# Altium integrated library Customized_Library1.intlib: 79 symbols
Pins are listed as number, name and electrical type; pins without a type are passive.

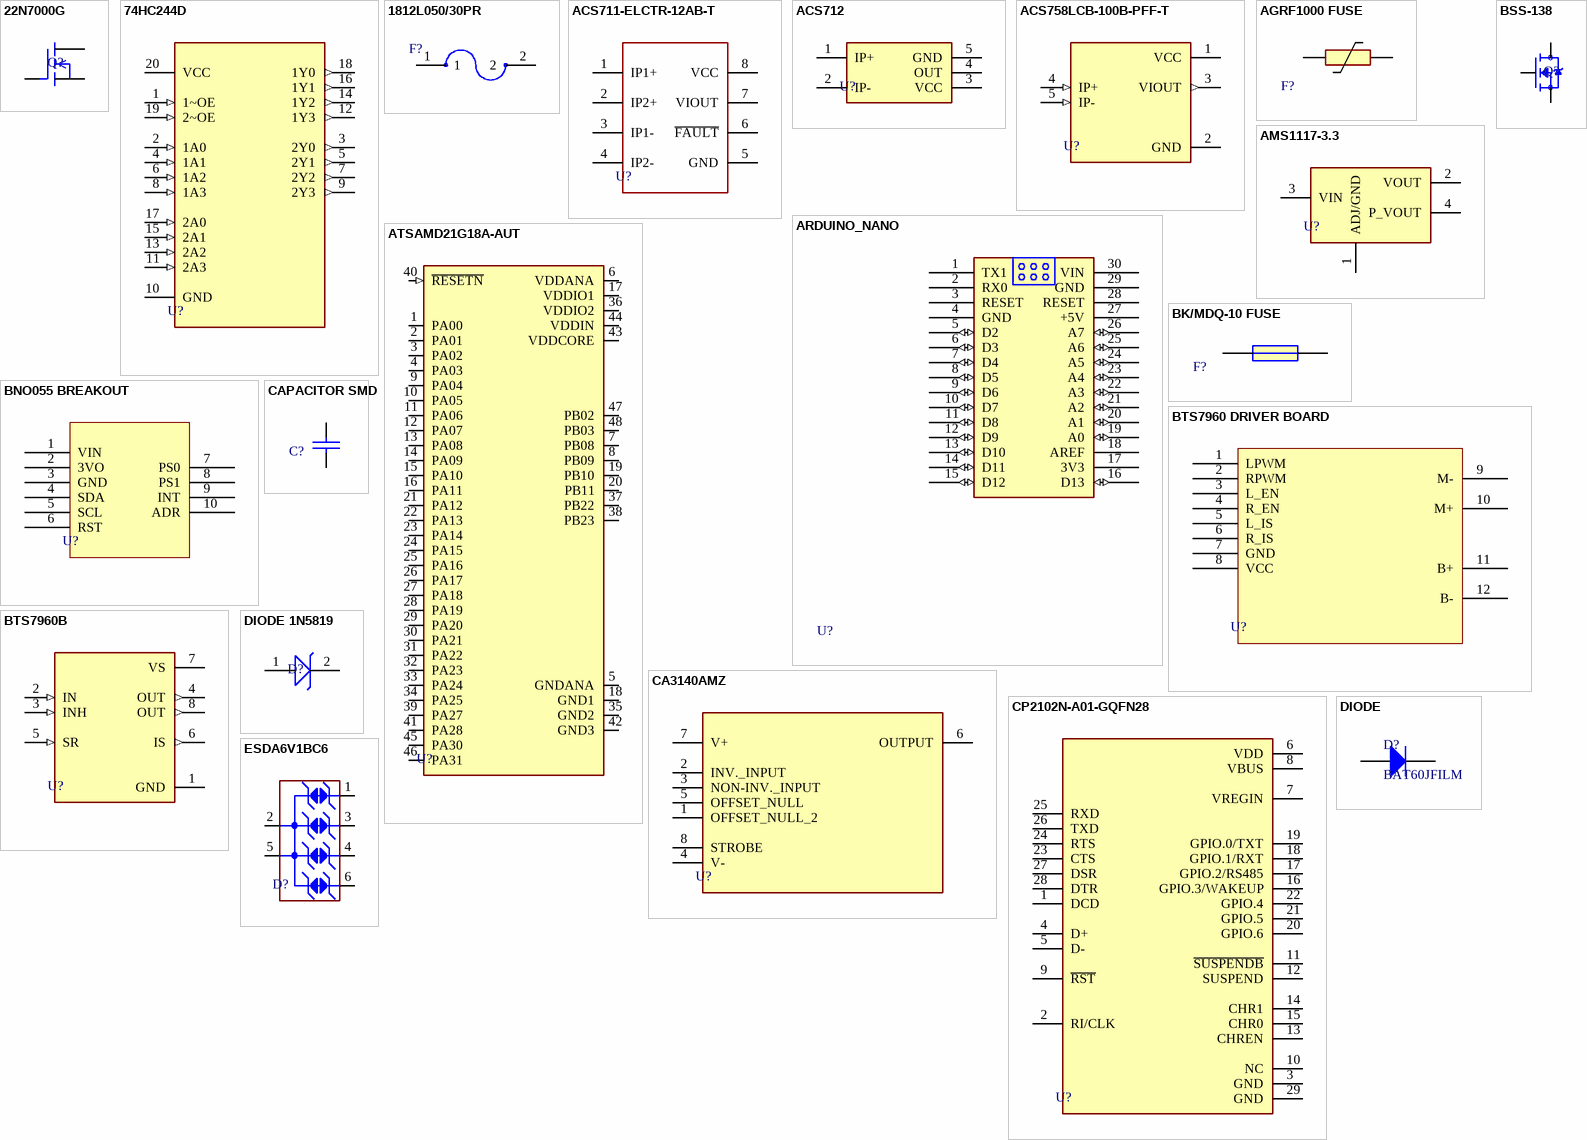
[diagram p0: symbols 22N7000G to ESDA6V1BC6]

## 22N7000G
designator Q?
N-Channel 60 V 200mA (Tj) 1W (Tc) Through Hole TO-92-3
footprint 2N7000G
pins: 1 S, 2 G, 3 D

## 74HC244D
designator U?
Buffer, Non-Inverting 2 Element 4 Bit per Element 3-State Output 20-SO
footprint 74HC244D (Buffer, Non-Inverting 2 Element 4 Bit per Element 3-State Output 20-SO)
pins: 1 1~OE (in), 2 1A0 (in), 3 2Y0 (out), 4 1A1 (in), 5 2Y1 (out), 6 1A2 (in), 7 2Y2 (out), 8 1A3 (in), 9 2Y3 (out), 10 GND, 11 2A3 (in), 12 1Y3 (out), 13 2A2 (in), 14 1Y2 (out), 15 2A1 (in), 16 1Y1 (out), 17 2A0 (in), 18 1Y0 (out), 19 2~OE (in), 20 VCC (power)

## 1812L050/30PR
designator F?
PTC Resettable Fuse 0.5A(hold) 1A(trip) 30VDC 100A 0.8W 0.15s 0.15Ohm SMD Solder Pad 1812 T/R
footprint 1812L050/30PR (PTC Resettable Fuse 0.5A(hold) 1A(trip) 30VDC 100A 0.8W 0.15s 0.15Ohm SMD Solder Pad 1812 T/R)
pins: 1, 2

## ACS711-ELCTR-12AB-T
designator U?  (value not drawn)
CURRENT SENSOR
footprint ACS711-ELCTR-12AB-T
pins: 1 IP1+, 2 IP2+, 3 IP1-, 4 IP2-, 5 GND, 6 ~{FAULT}, 7 VIOUT, 8 VCC

## ACS712
designator U?  (value not drawn)
CURRENT SENSOR BOARD
footprint ACS712 (CURRENT SENSOR)
pins: 1 IP+, 2 IP-, 3 VCC, 4 OUT, 5 GND

## ACS758LCB-100B-PFF-T
designator U?
Current Sensor 100A 1 Channel Hall Effect, Open Loop Bidirectional 5-CB Formed Leads, PFF
footprint ACS758LCB-100B-PFF-T (Current Sensor 100A 1 Channel Hall Effect, Open Loop Bidirectional 5-CB Formed Leads, PFF)
pins: 1 VCC (power), 2 GND (power), 3 VIOUT (out), 4 IP+ (in), 5 IP- (in)

## AGRF1000 FUSE
designator F?, comment Resettable Fuse  (value not drawn)
HOLD CURRENT 9.6 AMP, TRIP CURRENT 18.5 AMP
footprint AGRF1000 FUSE (Resettable_Fuse)
pins: 1, 2

## AMS1117-3.3
designator U?
VOLTAGE REGULATOR INPUT-5V;OUTPUT-3V3
footprint AMS1117-3.3
pins: 1 ADJ/GND, 2 VOUT, 3 VIN, 4 P_VOUT

## ARDUINO_NANO
designator U?
DEVELOPMENT BOARD
footprint ARDUINO_NANO
pins: 1 TX1, 2 RX0, 3 RESET, 4 GND (power), 5 D2 (io), 6 D3 (io), 7 D4 (io), 8 D5 (io), 9 D6 (io), 10 D7 (io), 11 D8 (io), 12 D9 (io), 13 D10 (io), 14 D11 (io), 15 D12 (io), 16 D13 (io), 17 3V3 (power), 18 AREF, 19 A0 (io), 20 A1 (io), 21 A2 (io), 22 A3 (io), 23 A4 (io), 24 A5 (io), 25 A6 (io), 26 A7 (io), 27 +5V (power), 28 RESET, 29 GND (power), 30 VIN (power)

## ATSAMD21G18A-AUT
designator U?
ARM® Cortex®-M0+ SAM D21G, Functional Safety (FuSa) Microcontroller IC 32-Bit Single-Core 48MHz 256KB (256K x 8) FLASH 48-TQFP (7x7)
footprint ATSAMD21G18A-AUT (ARM® Cortex®-M0+ SAM D21G, Functional Safety (FuSa) Microcontroller IC 32-Bit Single-Core 48MHz 256KB (256K x 8) FLASH 48-TQFP (7x7))
pins: 1 PA00 (io), 2 PA01 (io), 3 PA02 (io), 4 PA03 (io), 5 GNDANA (power), 6 VDDANA (power), 7 PB08 (io), 8 PB09 (io), 9 PA04 (io), 10 PA05 (io), 11 PA06 (io), 12 PA07 (io), 13 PA08 (io), 14 PA09 (io), 15 PA10 (io), 16 PA11 (io), 17 VDDIO1 (power), 18 GND1 (power), 19 PB10 (io), 20 PB11 (io), 21 PA12 (io), 22 PA13 (io), 23 PA14 (io), 24 PA15 (io), 25 PA16 (io), 26 PA17 (io), 27 PA18 (io), 28 PA19 (io), 29 PA20 (io), 30 PA21 (io), 31 PA22 (io), 32 PA23 (io), 33 PA24 (io), 34 PA25 (io), 35 GND2 (power), 36 VDDIO2 (power), 37 PB22 (io), 38 PB23 (io), 39 PA27 (io), 40 ~{RESETN} (in), 41 PA28 (io), 42 GND3 (power), 43 VDDCORE (power), 44 VDDIN (power), 45 PA30 (io), 46 PA31 (io), 47 PB02 (io), 48 PB03 (io)

## BK/MDQ-10 FUSE
designator F?, comment FUSE 15 AMP  (value not drawn)
OVERCURRENT PROTECTION
footprint BK/MDQ-10
pins: 1, 2

## BNO055 BREAKOUT
designator U?
10 PIN, 2.54mm pitch
footprint BNO055 BREAKOUT
pins: 1 VIN, 2 3VO, 3 GND, 4 SDA, 5 SCL, 6 RST, 7 PS0, 8 PS1, 9 INT, 10 ADR

## BSS-138
designator Q?, comment N CHANNEL FIELD EFFECT TRANSISTOR  (value not drawn)
MOSFET
footprint BSS-138
pins: 1 G, 2 S, 3 D

## BTS7960 DRIVER BOARD
designator U?
MOTOR DRIVER, 12 PIN
footprint BTS7960_DRIVER_BOARD
pins: 1 LPWM, 2 RPWM, 3 L_EN, 4 R_EN, 5 L_IS, 6 R_IS, 7 GND, 8 VCC, 9 M-, 10 M+, 11 B+, 12 B-

## BTS7960B
designator U?
Half Bridge Driver DC Motors, General Purpose DMOS PG-TO263-7-1
footprint BTS7960B (Footprint not found)
pins: 1 GND (power), 2 IN (in), 3 INH (in), 4 OUT (out), 5 SR (in), 6 IS (out), 7 VS (power), 8 OUT (out)

## CA3140AMZ
designator U?
General Purpose Amplifier 1 Circuit - 8-SOIC
footprint CA3140AMZ
pins: 1 OFFSET_NULL_2, 2 INV._INPUT, 3 NON-INV._INPUT, 4 V- (power), 5 OFFSET_NULL, 6 OUTPUT, 7 V+ (power), 8 STROBE

## CAPACITOR SMD
designator C?
CAPACITOR
footprint CAPACITOR SMD
pins: 1, 2

## CP2102N-A01-GQFN28
designator U?
USB BRIDGE, USB to UART USB 2.0 UART INTERFACE 28-QFN
footprint CP2102N-A01-GQFN28
pins: 1 DCD, 2 RI/CLK, 3 GND, 4 D+, 5 D-, 6 VDD, 7 VREGIN, 8 VBUS, 9 ~{RST}, 10 NC, 11 ~{SUSPENDB}, 12 SUSPEND, 13 CHREN, 14 CHR1, 15 CHR0, 16 GPIO.3/WAKEUP, 17 GPIO.2/RS485, 18 GPIO.1/RXT, 19 GPIO.0/TXT, 20 GPIO.6, 21 GPIO.5, 22 GPIO.4, 23 CTS, 24 RTS, 25 RXD, 26 TXD, 27 DSR, 28 DTR, 29 GND

## DIODE
designator D?, comment BAT60JFILM
SMD COMPONENT
footprint DIODE SMD
pins: 1 A, 2 K

## DIODE 1N5819
designator D?
Diode Schottky 40V 1A Through Hole DO-41
footprint DIODE 1N5819
pins: 1 A, 2 C

## ESDA6V1BC6
designator D?
ESD PROTECTION
footprint ESDA6V1BC6
pins: 1 IO1, 2 IO2, 3 GND, 4 IO3, 5 IO4, 6 NC

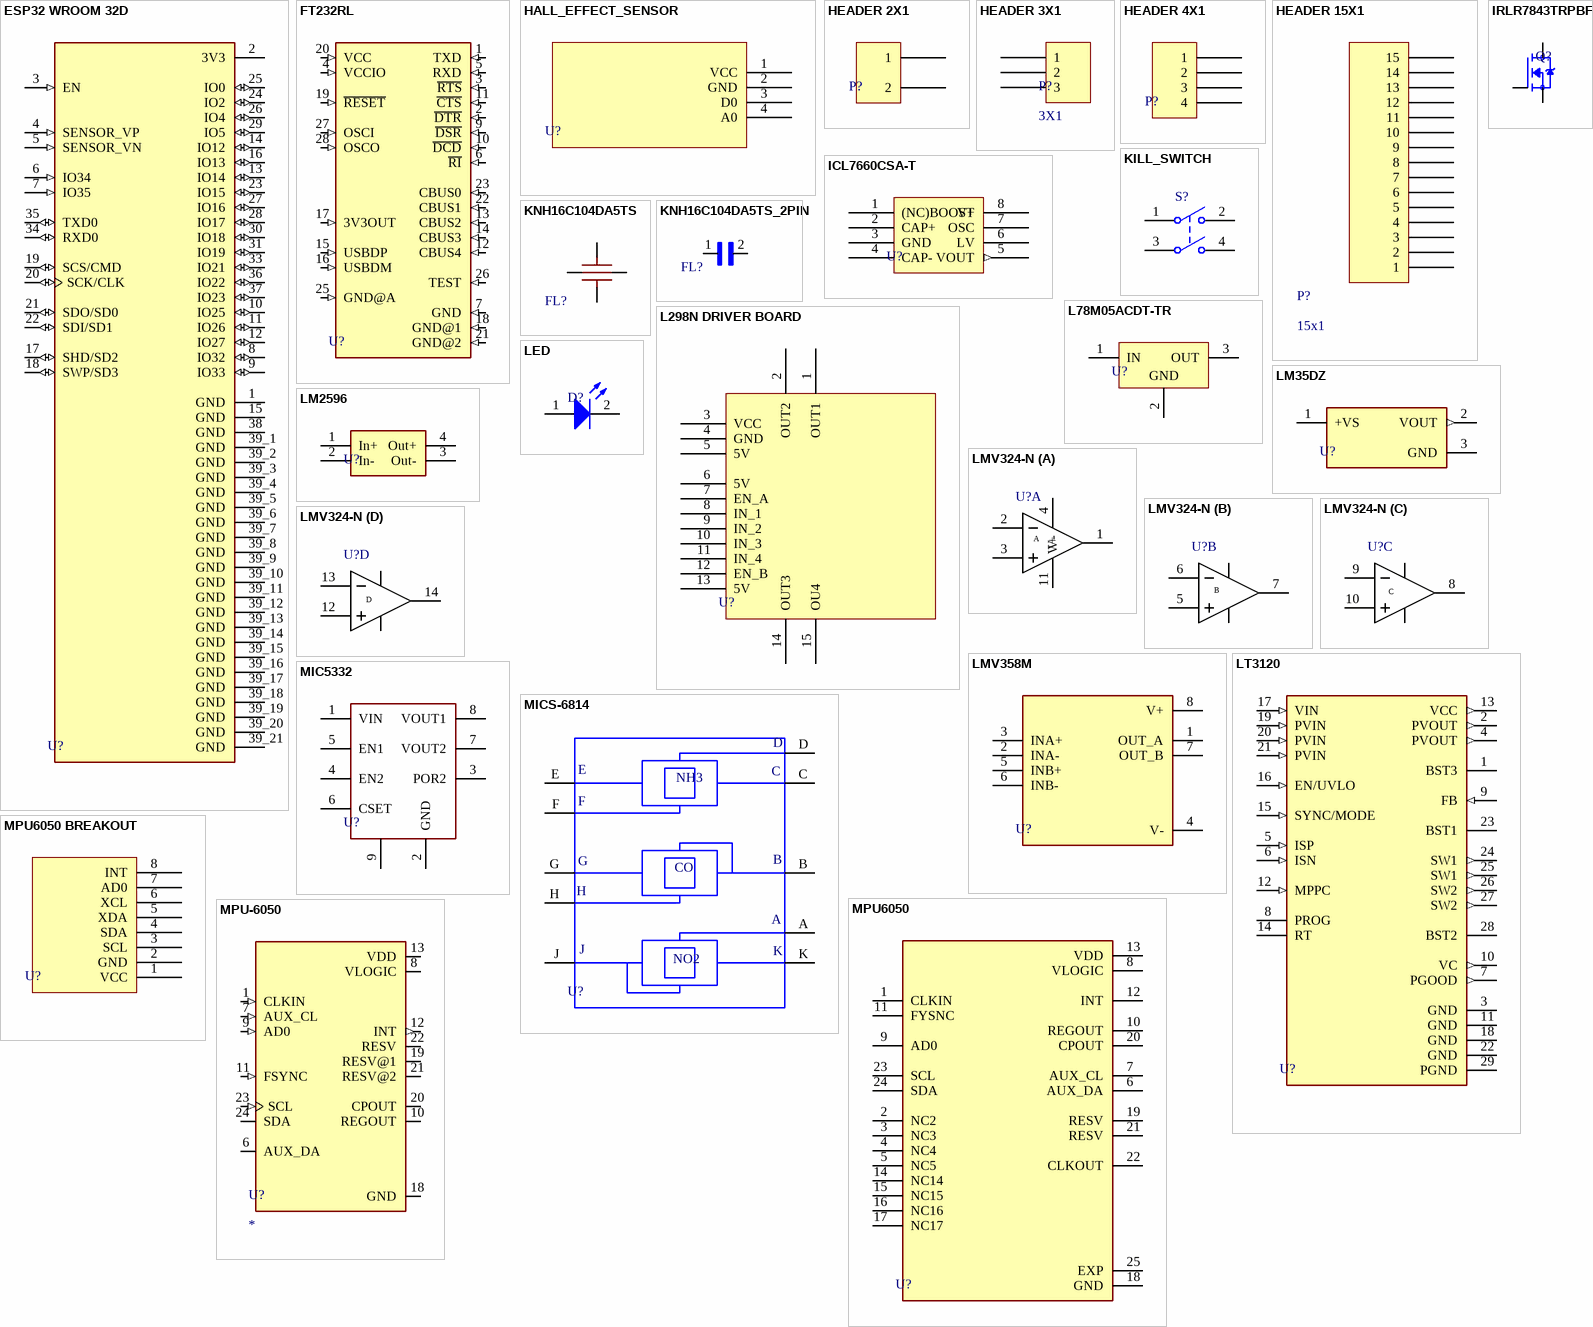
[diagram p1: symbols ESP32 WROOM 32D to MPU-6050]

## ESP32 WROOM 32D
designator U?
39 PIN RX TXRX MOD WIFI TRACE ANT SMD
footprint ESP32 WROOM 32D 4MB (RX TXRX MOD WIFI TRACE ANT SMD)
pins: 1 GND (power), 2 3V3 (power), 3 EN (in), 4 SENSOR_VP (in), 5 SENSOR_VN (in), 6 IO34 (in), 7 IO35 (in), 8 IO32 (io), 9 IO33 (io), 10 IO25 (io), 11 IO26 (io), 12 IO27 (io), 13 IO14 (io), 14 IO12 (io), 15 GND (power), 16 IO13 (io), 17 SHD/SD2 (io), 18 SWP/SD3 (io), 19 SCS/CMD (io), 20 SCK/CLK (io), 21 SDO/SD0 (io), 22 SDI/SD1 (io), 23 IO15 (io), 24 IO2 (io), 25 IO0 (io), 26 IO4 (io), 27 IO16 (io), 28 IO17 (io), 29 IO5 (io), 30 IO18 (io), 31 IO19 (io), 33 IO21 (io), 34 RXD0 (io), 35 TXD0 (io), 36 IO22 (io), 37 IO23 (io), 38 GND (power), 39_1 GND (power), 39_2 GND (power), 39_3 GND (power), 39_4 GND (power), 39_5 GND (power), 39_6 GND (power), 39_7 GND (power), 39_8 GND (power), 39_9 GND (power), 39_10 GND (power), 39_11 GND (power), 39_12 GND (power), 39_13 GND (power), 39_14 GND (power), 39_15 GND (power), 39_16 GND (power), 39_17 GND (power), 39_18 GND (power), 39_19 GND (power), 39_20 GND (power), 39_21 GND (power)

## FT232RL
designator U?
USB INTERFACE
footprint FT232RL
pins: 1 TXD (in), 2 ~{DTR} (in), 3 ~{RTS} (in), 4 VCCIO (in), 5 RXD (in), 6 ~{RI} (in), 7 GND (in), 9 ~{DSR} (in), 10 ~{DCD} (in), 11 ~{CTS} (in), 12 CBUS4 (in), 13 CBUS2 (in), 14 CBUS3 (in), 15 USBDP (in), 16 USBDM (in), 17 3V3OUT (in), 18 GND@1 (in), 19 ~{RESET} (in), 20 VCC (in), 21 GND@2 (in), 22 CBUS1 (in), 23 CBUS0 (in), 25 GND@A (in), 26 TEST (in), 27 OSCI (in), 28 OSCO (in)

## HALL_EFFECT_SENSOR
designator U?
LM393 MAGNETIC FIELD DETECTOR, 4 PIN
footprint HALL EFFECT SENSOR
pins: 1 VCC, 2 GND, 3 D0, 4 A0

## HEADER 2X1
designator P?, comment 2x1  (value not drawn)
2.54 mm Male/Female Header
footprint MALE HEADER 2x1 (2.54 mm)
footprint FEMALE HEADER 2X1
pins: 1, 2

## HEADER 3X1
designator P?, comment 3X1
2.54 mm Male/Female Header
footprint FEMALE HEADER 3X1
footprint MALE HEADER 3X1
pins: 1 (power), 2, 3 (power)

## HEADER 4X1
designator P?, comment 4x1  (value not drawn)
2.54 mm, MALE/FEMALE HEADER
footprint MALE HEADER 4x1 (2.54 mm)
footprint FEMALE HEADER 4X1
pins: 1, 2, 3, 4

## HEADER 15X1
designator P?, comment 15x1
2.54 mm, MALE/FEMALE HEADER
footprint MALE HEADER 15X1
footprint FEMALE HEADER 15X1
pins: 1, 2, 3, 4, 5, 6, 7, 8, 9, 10, 11, 12, 13, 14, 15

## ICL7660CSA-T
designator U?  (value not drawn)
DC-DC VLOTAGE REGULATOR
footprint ICL7660CSA-T
pins: 1 (NC)BOOST, 2 CAP+, 3 GND (power), 4 CAP-, 5 VOUT (out), 6 LV, 7 OSC, 8 V+ (power)

## IRLR7843TRPBF
designator Q?  (value not drawn)
MOSFET
footprint IRLR7843TRPBF
pins: 1 G, 2 D, 3 S

## KILL_SWITCH
designator S?
Double-Pole, Single-Throw Switch; Published: 24-Mar-1999; LatestRevisionDate: 17-Jul-2002; LatestRevisionNote: Re-released for DXP Platform.; PackageReference: DPST-4; Publisher: Altium Limited; PackageDescription: Switch; 4 Leads
footprint KILL_SWITCH
pins: 1 COMMON1, 2 NO1, 3 COMMON2, 4 NO2

## KNH16C104DA5TS
designator FL?  (value not drawn)
FILTER
footprint KNH16C104DA5TS
pins: 1 P$1, 2 GND, 3 P$2, 4 GND

## KNH16C104DA5TS_2PIN
designator FL?  (value not drawn)
FILTER
footprint KNH16C104DA5TS_2PIN
pins: 1, 2

## L78M05ACDT-TR
designator U?
Linear Voltage Regulator IC Positive Fixed 1 Output 500mA DPAK
footprint L78M05ACDT-TR
pins: 1 IN (power), 2 GND (power), 3 OUT (power)

## L298N DRIVER BOARD
designator U?
MOTOR DRIVER BOARD, 15 PIN
footprint L298N_DRIVER_BOARD
pins: 1 OUT1, 2 OUT2, 3 VCC, 4 GND, 5 5V, 6 5V, 7 EN_A, 8 IN_1, 9 IN_2, 10 IN_3, 11 IN_4, 12 EN_B, 13 5V, 14 OUT3, 15 OU4

## LED
designator D?, comment COLOR  (value not drawn)
SMD COMPONENT, Typical RED, GREEN, YELLOW, AMBER GaAs LED
footprint LED SMD
pins: 1 A, 2 K

## LM35DZ
designator U?
Temperature Sensor Analog, Local 0°C ~ 100°C 10mV/°C TO-92-3
footprint LM35DZ
pins: 1 +VS (power), 2 VOUT (out), 3 GND (power)

## LM2596
designator U?
DC-DC BUCK CONVERTER, MAX 3 AMP, OUTPUT 1.25-35 V
footprint LM2596
pins: 1 In+, 2 In-, 3 Out-, 4 Out+

## LMV324-N
designator U?
ON Semiconductor LV R2R OPAMPK; Mfr_Name: Texas Instruments; Manufacturer_Part_Number: LMV324-N_D_14; PartNumber: LMV324M; Manufacturer: NationalSemiconductor; Characteristics: LMV324MGeneralPurposeLowVoltageR-ROut1MHzQuadOpAmp; CompType: OpAmpIC; TaMin_C: -400; TaMax_C: 850; ComponentLink1DescBC: LMV324Datasheet; ComponentLink2DescA4: LMV324WebPage; ComponentLink3DescAC: M14APackageWebPage; Copyright: Copyright (C) 2021 Ultra Librarian. All rights reserved.; RefDes: RefDes; Type: DEV; SymbolVersion: 2008-07-09; PackageDescription: 14LeadSOIC; PackageReference: M14A_L; RoHS: O; ComponentLink1URL: http//wwwnationalcom/ds/LM/LMV324pdf; ComponentLink2URL: http//wwwnationalcom/pf/LM/LMV324html; ComponentLink3URL: http//wwwnationalcom/packaging/folders/m14ahtml; Version: B1608; LatestRevisionDate: 2009-03-16; LatestRevisionNote: MassUpdate; Publisher: NationalSemiconductor; Published: 2009-03-16
footprint LMV324
part A pins: 1 OUT, 2 IN-, 3 IN+, 4 V+, 11 V-
part B pins: 5 IN+, 6 IN-, 7 OUT
part C pins: 8 OUT, 9 IN-, 10 IN+
part D pins: 12 IN+, 13 IN-, 14 OUT
part A text: A
part B text: B
part C text: C
part D text: D

## LMV358M
designator U?
General Purpose, Low Voltage, Rail-to-Rail Output Operational Amplifiers 8-SOIC -40 to 125
footprint LMV358M
pins: 1 OUT_A, 2 INA-, 3 INA+, 4 V-, 5 INB+, 6 INB-, 7 OUT_B, 8 V+

## LT3120
designator U?
26V, 9A Low-IQ CC/CV / Monolithic Buck-Boost Converter
footprint LT3120
pins: 1 BST3, 2 PVOUT (out), 3 GND (power), 4 PVOUT (out), 5 ISP (in), 6 ISN (in), 7 PGOOD (out), 8 PROG, 9 FB (in), 10 VC (out), 11 GND (power), 12 MPPC (in), 13 VCC (out), 14 RT, 15 SYNC/MODE (in), 16 EN/UVLO (in), 17 VIN (in), 18 GND (power), 19 PVIN (in), 20 PVIN (in), 21 PVIN (in), 22 GND (power), 23 BST1, 24 SW1 (out), 25 SW1 (out), 26 SW2 (out), 27 SW2 (out), 28 BST2, 29 PGND (power)

## MIC5332
designator U?, comment LDO  (value not drawn)
LDO VOLTAGE REGULATOR
footprint MIC5332
pins: 1 VIN, 2 GND (power), 3 POR2, 4 EN2, 5 EN1, 6 CSET, 7 VOUT2, 8 VOUT1, 9 PAD (power)

## MICS-6814
designator U?
NH3,CO,NO2 SENSOR
footprint MICS-6814
pins: A RS2, B RH1/RS1_RED, C RH1_NH3, D RS1_NH3, E RH2_NH3, F RS2_NH3, G RH2_RED, H RS2_RED, J RH1/RS1_OX, K RH2_OX
text: NH3; CO; NO2

## MPU6050
designator U?
IMU SENSOR
footprint MPU6050
pins: 1 CLKIN, 2 NC2, 3 NC3, 4 NC4, 5 NC5, 6 AUX_DA, 7 AUX_CL, 8 VLOGIC, 9 AD0, 10 REGOUT, 11 FYSNC, 12 INT, 13 VDD, 14 NC14, 15 NC15, 16 NC16, 17 NC17, 18 GND, 19 RESV, 20 CPOUT, 21 RESV, 22 CLKOUT, 23 SCL, 24 SDA, 25 EXP

## MPU6050 BREAKOUT
designator U?
8 pin, 2.54mm pitch
footprint MPU6050 BREAKOUT (8 PIN, 2.54mm)
pins: 1 VCC, 2 GND, 3 SCL, 4 SDA, 5 XDA, 6 XCL, 7 AD0, 8 INT

## MPU-6050
designator U?
MPU-6050 series Accelerometer, Gyroscope, 3 Axis Sensor Evaluation Board
footprint MPU-6050 (MPU-6050 series Accelerometer, Gyroscope, 3 Axis Sensor Evaluation Board)
pins: 1 CLKIN (in), 6 AUX_DA (io), 7 AUX_CL (in), 8 VLOGIC (power), 9 AD0 (in), 10 REGOUT, 11 FSYNC (in), 12 INT (out), 13 VDD (power), 18 GND (power), 19 RESV@1, 20 CPOUT, 21 RESV@2, 22 RESV, 23 SCL (in), 24 SDA (io)

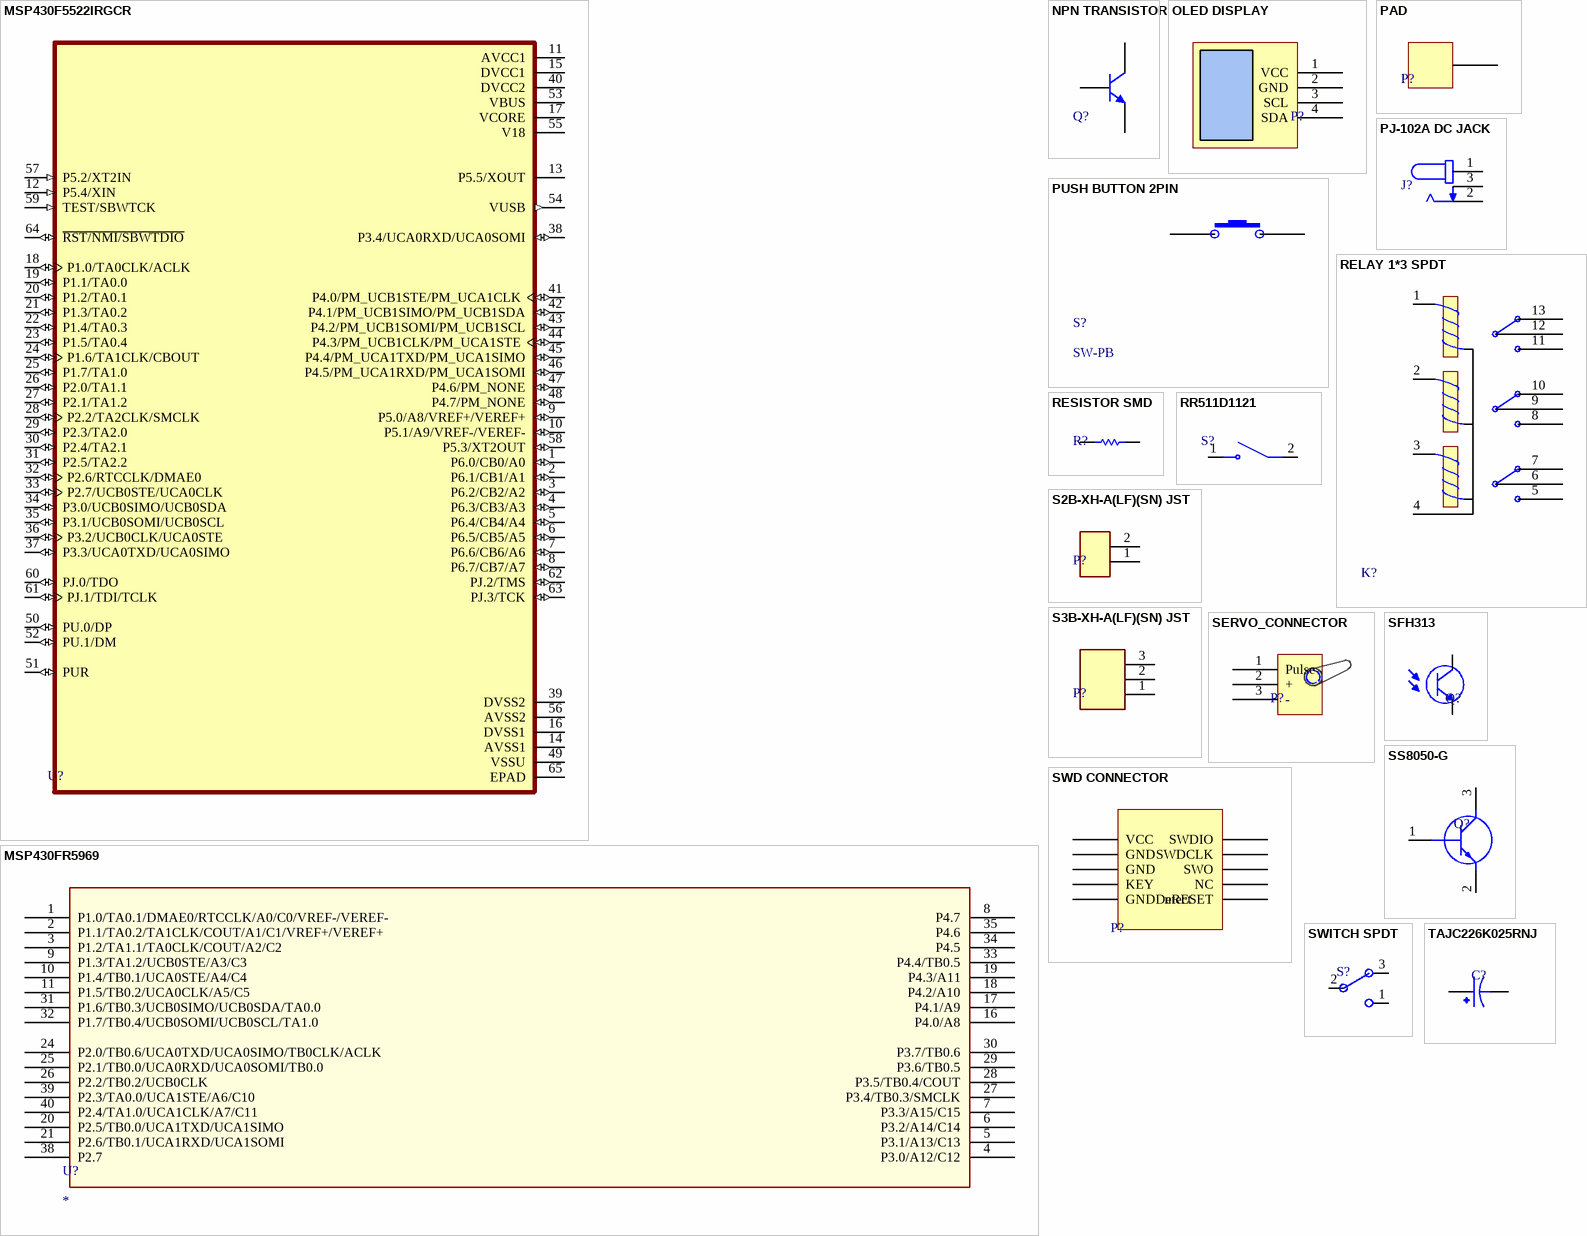
[diagram p2: symbols MSP430F5522IRGCR to TAJC226K025RNJ]

## MSP430F5522IRGCR
designator U?
25 MHz MCU with 32KB Flash, 8KB SRAM, 12-bit ADC, comparator, DMA, UART/SPI/I2C, USB, HW multiplier
footprint MSP430F5522IRGCR (25 MHz MCU with 32KB Flash, 8KB SRAM, 12-bit ADC, comparator, DMA, UART/SPI/I2C, USB, HW multiplier)
pins: 1 P6.0/CB0/A0 (io), 2 P6.1/CB1/A1 (io), 3 P6.2/CB2/A2 (io), 4 P6.3/CB3/A3 (io), 5 P6.4/CB4/A4 (io), 6 P6.5/CB5/A5 (io), 7 P6.6/CB6/A6 (io), 8 P6.7/CB7/A7 (io), 9 P5.0/A8/VREF+/VEREF+ (io), 10 P5.1/A9/VREF-/VEREF- (io), 11 AVCC1 (power), 12 P5.4/XIN (in), 13 P5.5/XOUT (power), 14 AVSS1 (power), 15 DVCC1 (power), 16 DVSS1 (power), 17 VCORE (power), 18 P1.0/TA0CLK/ACLK (io), 19 P1.1/TA0.0 (io), 20 P1.2/TA0.1 (io), 21 P1.3/TA0.2 (io), 22 P1.4/TA0.3 (io), 23 P1.5/TA0.4 (io), 24 P1.6/TA1CLK/CBOUT (io), 25 P1.7/TA1.0 (io), 26 P2.0/TA1.1 (io), 27 P2.1/TA1.2 (io), 28 P2.2/TA2CLK/SMCLK (io), 29 P2.3/TA2.0 (io), 30 P2.4/TA2.1 (io), 31 P2.5/TA2.2 (io), 32 P2.6/RTCCLK/DMAE0 (io), 33 P2.7/UCB0STE/UCA0CLK (io), 34 P3.0/UCB0SIMO/UCB0SDA (io), 35 P3.1/UCB0SOMI/UCB0SCL (io), 36 P3.2/UCB0CLK/UCA0STE (io), 37 P3.3/UCA0TXD/UCA0SIMO (io), 38 P3.4/UCA0RXD/UCA0SOMI (io), 39 DVSS2 (power), 40 DVCC2 (power), 41 P4.0/PM_UCB1STE/PM_UCA1CLK (io), 42 P4.1/PM_UCB1SIMO/PM_UCB1SDA (io), 43 P4.2/PM_UCB1SOMI/PM_UCB1SCL (io), 44 P4.3/PM_UCB1CLK/PM_UCA1STE (io), 45 P4.4/PM_UCA1TXD/PM_UCA1SIMO (io), 46 P4.5/PM_UCA1RXD/PM_UCA1SOMI (io), 47 P4.6/PM_NONE (io), 48 P4.7/PM_NONE (io), 49 VSSU (power), 50 PU.0/DP (io), 51 PUR (io), 52 PU.1/DM (io), 53 VBUS (power), 54 VUSB (out), 55 V18 (power), 56 AVSS2 (power), 57 P5.2/XT2IN (in), 58 P5.3/XT2OUT (io), 59 TEST/SBWTCK (in), 60 PJ.0/TDO (io), 61 PJ.1/TDI/TCLK (io), 62 PJ.2/TMS (io), 63 PJ.3/TCK (io), 64 ~{RST/NMI/SBWTDIO} (io), 65 EPAD (power)

## MSP430FR5969
designator U?
16 MHz MCU with 64KB FRAM, 2KB SRAM, AES, 12-bit ADC, comparator, DMA, UART/SPI/I2C, timer
footprint MSP430FR5969 (16 MHz MCU with 64KB FRAM, 2KB SRAM, AES, 12-bit ADC, comparator, DMA, UART/SPI/I2C, timer)
pins: 1 P1.0/TA0.1/DMAE0/RTCCLK/A0/C0/VREF-/VEREF-, 2 P1.1/TA0.2/TA1CLK/COUT/A1/C1/VREF+/VEREF+, 3 P1.2/TA1.1/TA0CLK/COUT/A2/C2, 4 P3.0/A12/C12, 5 P3.1/A13/C13, 6 P3.2/A14/C14, 7 P3.3/A15/C15, 8 P4.7, 9 P1.3/TA1.2/UCB0STE/A3/C3, 10 P1.4/TB0.1/UCA0STE/A4/C4, 11 P1.5/TB0.2/UCA0CLK/A5/C5, 16 P4.0/A8, 17 P4.1/A9, 18 P4.2/A10, 19 P4.3/A11, 20 P2.5/TB0.0/UCA1TXD/UCA1SIMO, 21 P2.6/TB0.1/UCA1RXD/UCA1SOMI, 24 P2.0/TB0.6/UCA0TXD/UCA0SIMO/TB0CLK/ACLK, 25 P2.1/TB0.0/UCA0RXD/UCA0SOMI/TB0.0, 26 P2.2/TB0.2/UCB0CLK, 27 P3.4/TB0.3/SMCLK, 28 P3.5/TB0.4/COUT, 29 P3.6/TB0.5, 30 P3.7/TB0.6, 31 P1.6/TB0.3/UCB0SIMO/UCB0SDA/TA0.0, 32 P1.7/TB0.4/UCB0SOMI/UCB0SCL/TA1.0, 33 P4.4/TB0.5, 34 P4.5, 35 P4.6, 38 P2.7, 39 P2.3/TA0.0/UCA1STE/A6/C10, 40 P2.4/TA1.0/UCA1CLK/A7/C11

## NPN TRANSISTOR
designator Q?, comment ID  (value not drawn)
NPN Bipolar Transistor
footprint NPN SOT-23 (TRANSISTOR)
pins: 1 B, 2 E, 3 C

## OLED DISPLAY
designator P?
0.96" OLED display 4 pin
footprint OLED DISPLAY
pins: 1 VCC, 2 GND, 3 SCL, 4 SDA

## PAD
designator P?, comment 1 PIN  (value not drawn)
SOLDER PAD
footprint PAD 5*5 MM
footprint PAD 4*4 MM
pins: 1 PAD_1

## PJ-102A DC JACK
designator J?
2.0 x 6.5 mm, 2.5 A, Horizontal, Through Hole, Tapered Pins, Dc Power Jack Connector
footprint PJ-102A
pins: 1, 2, 3

## PUSH BUTTON 2PIN
designator S?, comment SW-PB
2 PIN- 5 mm
footprint PUSH BUTTON 2PIN (5mm)
pins: 1, 2

## RELAY 1*3 SPDT
designator K?
3 RELAY SWITCH
footprint RELAY 1*3 SPDT
pins: 1 R1S, 2 R2S, 3 R3S, 4 GND, 5 NO3, 6 COM3, 7 NC3, 8 NC2, 9 COM2, 10 NO2, 11 NO1, 12 COM1, 13 NC1

## RESISTOR SMD
designator R?, comment RES 1  (value not drawn)
Resistor,12K1,0603,1%,VISHAY
footprint RESISTOR SMD
pins: 1, 2

## RR511D1121
designator S?
Rocker Switch SPST 20A (AC) 125 V Panel Mount, Snap-In
footprint RR511D1121 (Rocker Switch SPST 20A (AC) 125 V Panel Mount, Snap-In)
footprint RR511D1121 Square (Rocker Switch SPST 20A (AC) 125 V Panel Mount, Snap-In)
pins: 1 NO (power), 2 COM

## S2B-XH-A(LF)(SN) JST
designator P?
Connector Header Through Hole, Right Angle 2 position 0.098" (2.50mm)
footprint S2B-XH-A(LF)(SN) JST
pins: 1, 2

## S3B-XH-A(LF)(SN) JST
designator P?
Conn Shrouded Header (4 Sides) HDR 3 POS 2.5mm
footprint S3B-XH-A(LF)(SN) JST
pins: 1, 2, 3

## SERVO_CONNECTOR
designator P?
3 PIN
footprint MALE HEADER 3X1
footprint FEMALE HEADER 3X1
pins: 1 Pulse (power), 2 +, 3 - (power)

## SFH313
designator Q?
Phototransistors 870nm Top View Radial - 2 Leads
footprint sfh313 (Phototransistors 870nm Top View Radial - 2 Leads)
footprint SFH313 bended (Phototransistors 870nm Top View Radial - 2 Leads)
pins: 1 E, 2 C

## SS8050-G
designator Q?
Bipolar (BJT) Transistor NPN 25 V 1.5 A 100MHz 300 mW Surface Mount SOT-23-3
footprint SS8050-G
pins: 1 B, 2 E, 3 C

## SWD CONNECTOR
designator P?, comment HEADER  (value not drawn)
5X2 PIN
footprint SWD CONNECTOR
pins: 1 VCC, 2 SWDIO, 3 GND, 4 SWDCLK, 5 GND, 6 SWO, 7 KEY, 8 NC, 9 GNDDetect, 10 nRESET

## SWITCH SPDT
designator S?
EG1218 SWITCH SLIDE SPDT 200MA 30V
footprint EG1218
pins: 1, 2, 3

## TAJC226K025RNJ
designator C?
Tantalum Capacitors
footprint TAJC226K025RNJ
pins: 1, 2

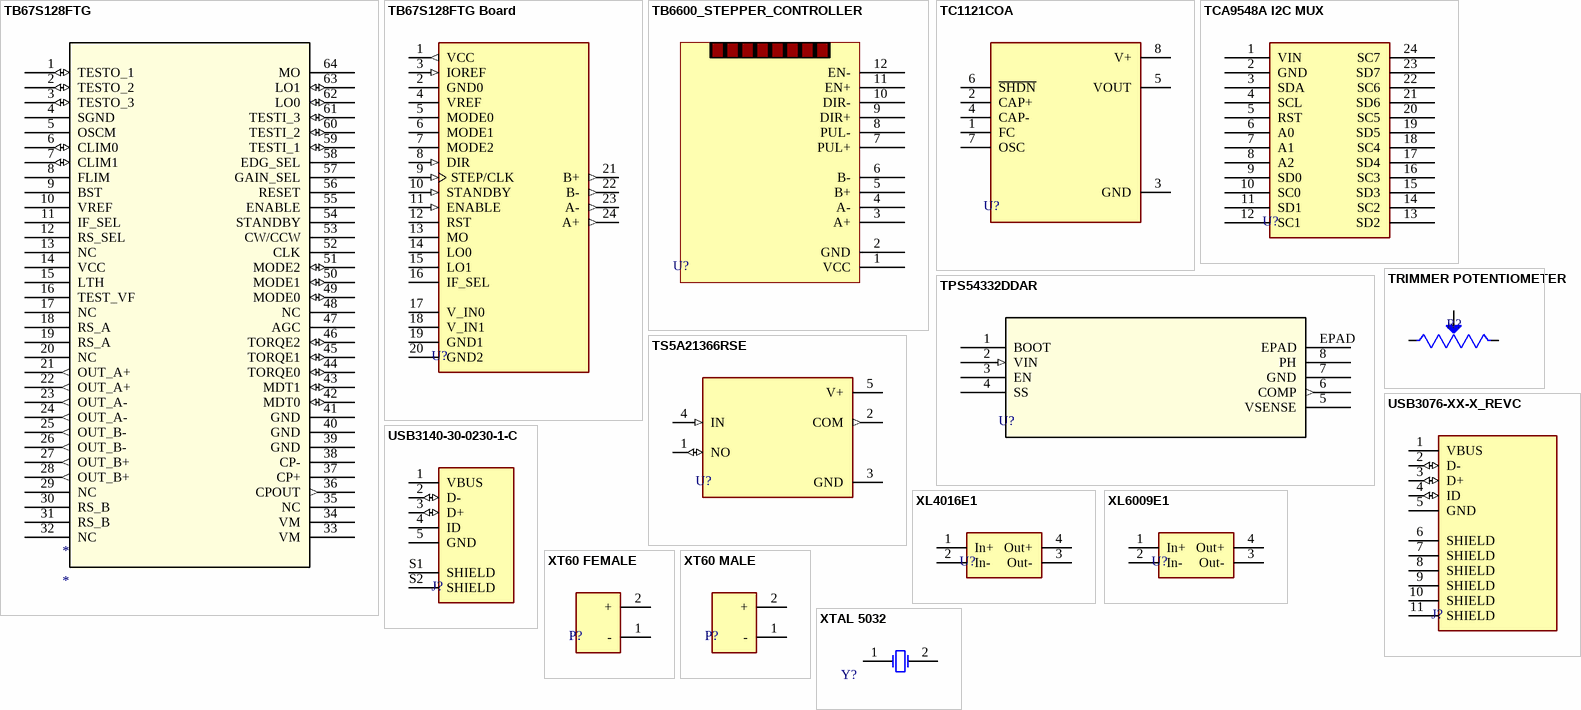
[diagram p3: symbols TB67S128FTG to XTAL 5032]

## TB67S128FTG
designator *
footprint TB67S128FTG-M
footprint TB67S128FTG-M
footprint TB67S128FTG
pins: 1 TESTO_1 (io), 2 TESTO_2 (io), 3 TESTO_3 (io), 4 SGND (power), 5 OSCM, 6 CLIM0 (io), 7 CLIM1 (io), 8 FLIM, 9 BST, 10 VREF (power), 11 IF_SEL, 12 RS_SEL, 13 NC, 14 VCC (power), 15 LTH, 16 TEST_VF, 17 NC, 18 RS_A, 19 RS_A, 20 NC, 21 OUT_A+ (out), 22 OUT_A+ (out), 23 OUT_A- (out), 24 OUT_A- (out), 25 OUT_B- (out), 26 OUT_B- (out), 27 OUT_B+ (out), 28 OUT_B+ (out), 29 NC, 30 RS_B, 31 RS_B, 32 NC, 33 VM, 34 VM, 35 NC, 36 CPOUT (out), 37 CP+, 38 CP-, 39 GND (power), 40 GND (power), 41 GND (power), 42 MDT0 (io), 43 MDT1 (io), 44 TORQE0 (io), 45 TORQE1 (io), 46 TORQE2 (io), 47 AGC, 48 NC, 49 MODE0 (io), 50 MODE1 (io), 51 MODE2 (io), 52 CLK, 53 CW/CCW, 54 STANDBY, 55 ENABLE, 56 RESET, 57 GAIN_SEL, 58 EDG_SEL, 59 TESTI_1 (io), 60 TESTI_2 (io), 61 TESTI_3 (io), 62 LO0 (io), 63 LO1 (io), 64 MO

## TB67S128FTG Board
designator U?
Bipolar Motor Driver Power MOSFET Parallel 48-WQFN (7x7) Breakout board
footprint TB67S128FTG Board
pins: 1 VCC (out), 2 GND0 (power), 3 IOREF (in), 4 VREF, 5 MODE0, 6 MODE1, 7 MODE2, 8 DIR (in), 9 STEP/CLK (in), 10 STANDBY (in), 11 ENABLE (in), 12 RST, 13 MO, 14 LO0, 15 LO1, 16 IF_SEL, 17 V_IN0 (power), 18 V_IN1 (power), 19 GND1 (power), 20 GND2 (power), 21 B+ (out), 22 B- (out), 23 A- (out), 24 A+ (out)

## TB6600_STEPPER_CONTROLLER
designator U?
STEPPER MOTOR DRIVER, 12 PIN
footprint TB6600 STEPPER CONTROLLER
pins: 1 VCC, 2 GND, 3 A+, 4 A-, 5 B+, 6 B-, 7 PUL+, 8 PUL-, 9 DIR+, 10 DIR-, 11 EN+, 12 EN-

## TC1121COA
designator U?
Charge Pump Switching Regulator IC Negative Fixed -Vin 1 Output 100mA 8-SOIC (0.154", 3.90mm Width)
footprint TC1121COA
pins: 1 FC, 2 CAP+, 3 GND, 4 CAP-, 5 VOUT, 6 ~{SHDN}, 7 OSC, 8 V+

## TCA9548A I2C MUX
designator U?
DEVELOPMENT BOARD I2C MULTIPLEXER
footprint TCA9548A I2C Mux (DEVELOPMENT BOARD)
pins: 1 VIN, 2 GND, 3 SDA, 4 SCL, 5 RST, 6 A0, 7 A1, 8 A2, 9 SD0, 10 SC0, 11 SD1, 12 SC1, 13 SD2, 14 SC2, 15 SD3, 16 SC3, 17 SD4, 18 SC4, 19 SD5, 20 SC5, 21 SD6, 22 SC6, 23 SD7, 24 SC7

## TPS54332DDAR
designator U?
IC REG BUCK ADJ 3.5A 8SOPWR
footprint TPS54332DDAR (IC REG BUCK ADJ 3.5A 8SOPWR)
footprint TPS54332DDAR-L
footprint TPS54332DDAR-M
pins: 1 BOOT, 2 VIN (in), 3 EN, 4 SS, 5 VSENSE, 6 COMP (out), 7 GND (power), 8 PH (power), EPAD

## TRIMMER POTENTIOMETER
designator R?
VARIABLE RESISTOR
footprint 3296W-1-250
footprint 3362P-1-103
pins: 1 CCW, 2 WIPER, 3 CW

## TS5A21366RSE
designator U?
0.9-Ω on-state resistance, 5-V, 1:1 (SPST), 1-channel analog switch (active high)
footprint TS5A21366RSE (0.9-? on-state resistance, 5-V, 1:1 (SPST), 1-channel analog switch (active high))
pins: 1 NO (io), 2 COM (out), 3 GND (power), 4 IN (in), 5 V+ (power)

## USB3076-XX-X_REVC
designator J?, comment USB B MICRO  (value not drawn)
USB INTERFACE
footprint USB3076-XX-X_REVC (USB INTERFACE)
pins: 1 VBUS (power), 2 D- (io), 3 D+ (io), 4 ID (io), 5 GND (power), 6 SHIELD (power), 7 SHIELD (power), 8 SHIELD (power), 9 SHIELD (power), 10 SHIELD (power), 11 SHIELD (power)

## USB3140-30-0230-1-C
designator J?, comment USB B MICRO  (value not drawn)
USB INTERFACE
footprint USB_MICRO_B
pins: 1 VBUS (power), 2 D- (io), 3 D+ (io), 4 ID, 5 GND (power), S1 SHIELD, S2 SHIELD

## XL4016E1
designator U?
DC-DC 9A 300W STEP-DOWN MODULE, 7-32 V OUTPUT
footprint XL4016E1 (DC-DC VOLTAGE CONVERTER)
pins: 1 In+, 2 In-, 3 Out-, 4 Out+

## XL6009E1
designator U?, comment DC-DC BOOST MODULE  (value not drawn)
3 AMP MAX, 5-35 V OUTPUT
footprint XL6009E1 (BUCK CONVERTER)
pins: 1 In+, 2 In-, 3 Out-, 4 Out+

## XT60 FEMALE
designator P?, comment HEADER, 2 PINS  (value not drawn)
CONNECTOR
footprint XT60 FEMALE
pins: 1 -, 2 +

## XT60 MALE
designator P?, comment HEADER, 2 PINS  (value not drawn)
CONNECTOR
footprint XT60 MALE
pins: 1 -, 2 +

## XTAL 5032
designator Y?, comment VALUE  (value not drawn)
SMD CRYSTAL OSCILLAOR
footprint XTAL SMD (25 MHz)
pins: 1 OSC1, 2 OSC2